# Altium footprint library ZLS_Lib.PcbLib: 25 footprints (part 1 of 2)
Each footprint in its own frame and in the unit in brackets; x right, y up, seen from the top. Pads: shape width x height; smd on the part's side, far side on the other; paste and mask are expansions set on the pad; w line width, h text height; cw(c..) or ccw(c..) is an arc to the next point about the centre after c.
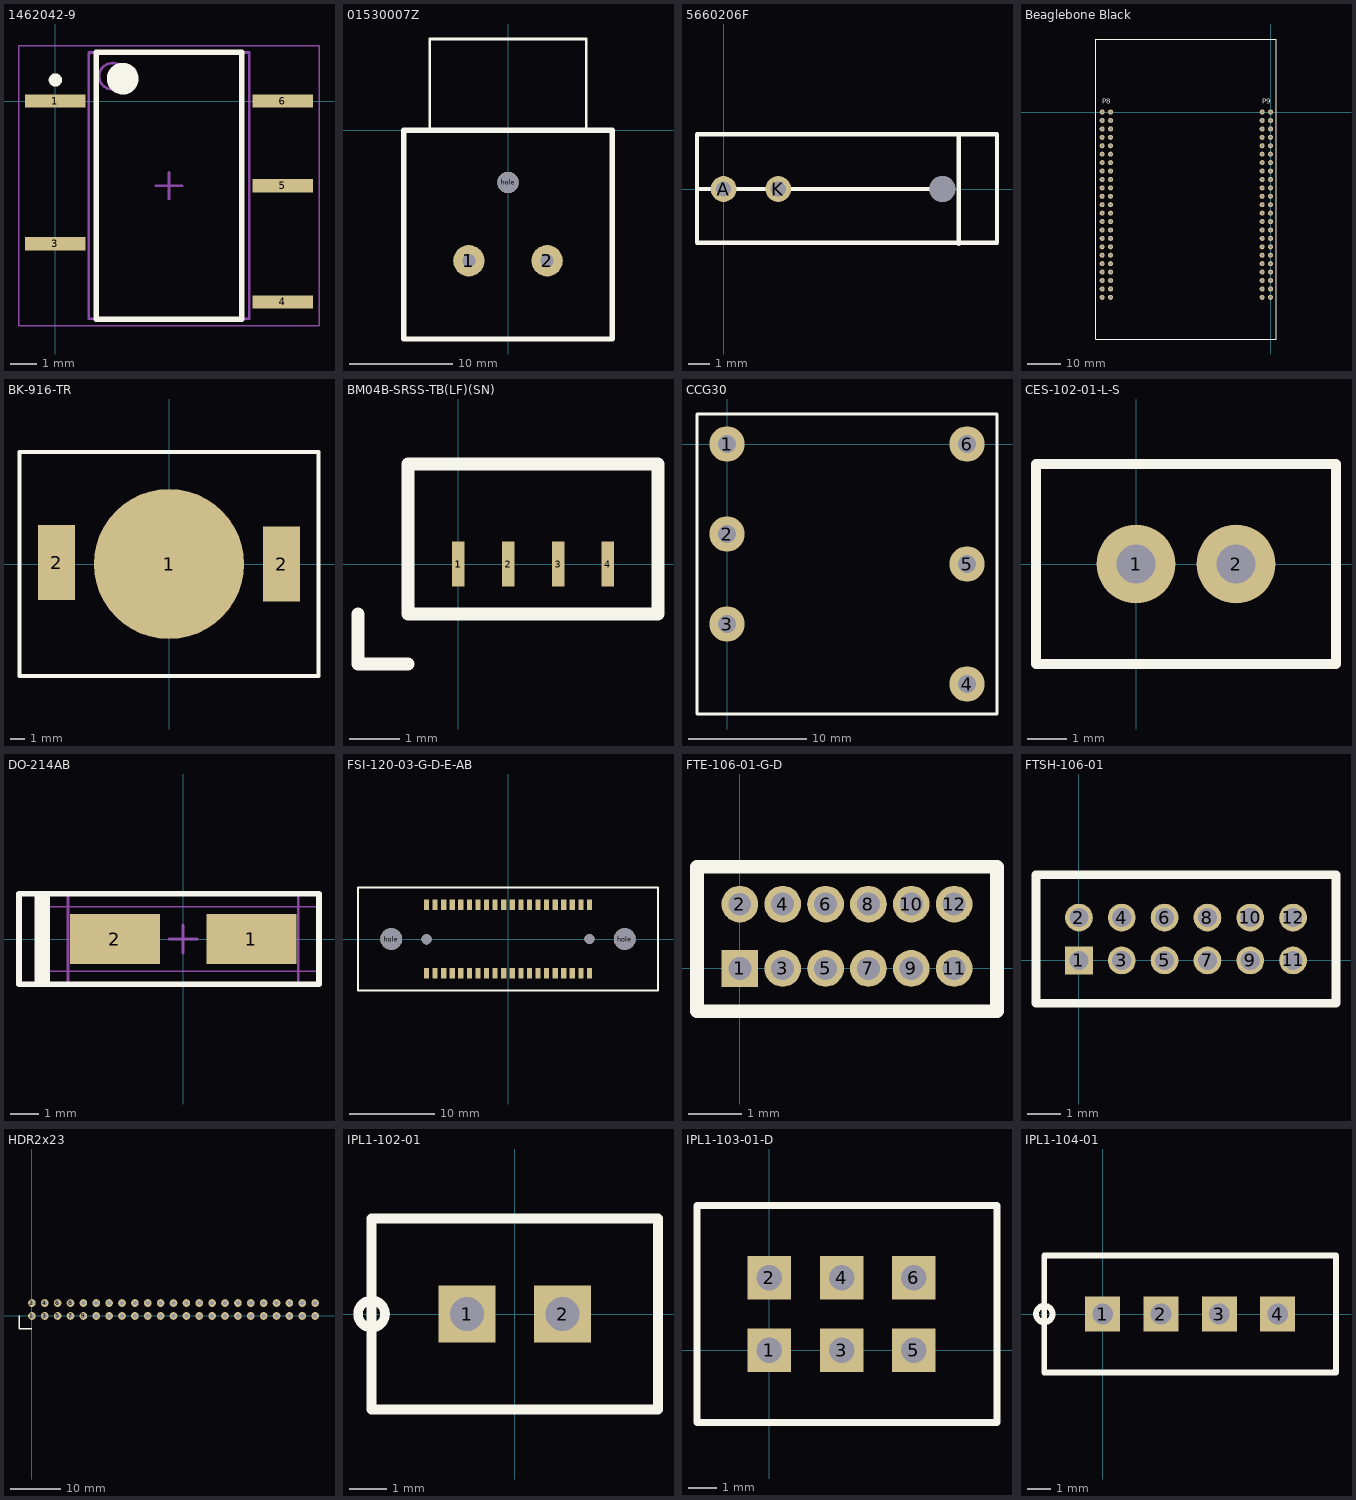
[diagram p0: the footprints below, top view; thin cyan lines are the x and y axes]

## 1462042-9 [mm] "RLY, 6-Leads, Body 10.08x6.08mm (max), Pitch 3.20mm, IPC Medium Density"
height 5.67
pads (5):
  rect 2.3x0.5 smd: 1(0,0) 3(0,-5.4) 4(8.6,-7.6) 5(8.6,-3.2) 6(8.6,0)
Top Overlay:
  circle w0.6: c2.55,0.85 r0.3
  circle w0.25: c0,0.8 r0.125
  lines w0.2: 1.55,-8.25 1.55,1.85 7.05,1.85 7.05,-8.25 1.55,-8.25
Mechanical 13:
  circle w0.1: c2.16,0.94 r0.5
  lines w0.1: 1.26,-8.24 1.26,1.84 7.34,1.84 7.34,-8.24 1.26,-8.24
Mechanical 15:
  lines w0.05: -1.375,-8.5 -1.375,2.1 9.975,2.1 9.975,-8.5 -1.375,-8.5
  lines w0.1: 3.8,-3.2 4.8,-3.2 ; 4.3,-3.7 4.3,-2.7
3D body "1462042-9.step": height 4.67, standoff 0, extent -0.735,-8.24 9.335,1.84

## 01530007Z [mil] "Fuse Holder"
height 300
pads (3):
  round 120 hole 50: 1(-150,-500) 2(150,-500)
  round 82 hole 82: hole(0,-200)
Top Overlay:
  lines w10: -300,0 -300,350 300,350 300,0
  lines w20: -400,-800 400,-800 400,0 -400,0 -400,-800
3D body: height 300, standoff 0, extent -399.98,-799.98 399.98,-0.02
3D body: height 300, standoff 0, extent -410,-810 410,-2
3D body: height 300, standoff 0, extent -299.98,0.02 299.98,349.98
3D body: height 300, standoff 0, extent -410,-810 410,0
3D body: height 300, standoff 0, extent -214,-564 214,-155
3D body: height 300, standoff 0, extent -214,-564 214,-155
3D body: height 300, standoff 0, extent -410,-810 410,0
3D body: height 300, standoff 0, extent -299.98,0.02 299.98,349.98
3D body: height 300, standoff 0, extent -410,-810 410,0
3D body: height 300, standoff 0, extent -399.98,-799.98 399.98,-0.02
3D body: height 300, standoff 0, extent -410,-810 410,0
3D body: height 300, standoff 0, extent -214,-564 214,-155
3D body: height 300, standoff 0, extent -214,-564 214,0
3D body: height 300, standoff 0, extent -410,-810 410,0
3D body: height 300, standoff 0, extent -399.98,-799.98 399.98,-0.02
3D body: height 300, standoff 0, extent -299.98,0.02 299.98,349.98

## 5660206F [mm]
pads (3):
  round 1.2 hole 0.7: A(0,0) K(2.54,0)
  round 1.21 hole 1.21: Alignment(10.16,0)
Top Overlay:
  lines w0.2: -1.235,0 1.34,0 ; 1.2,0 10.16,0 ; 8.491,2.54 8.781,2.54 12.7,2.54 12.7,-2.5 -1.235,-2.5 -1.235,2.54 3.815,2.54 7.192,2.54 10.922,2.54 10.922,-2.54
3D body: height 0, standoff 0, extent -0.702,-0.707 10.867,0.707
3D body: height 0, standoff 0, extent -1.335,-2.64 12.8,2.64
3D body: height 0, standoff 0, extent -1.234,-2.499 10.921,2.539
3D body: height 0, standoff 0, extent 10.923,-2.499 12.699,2.539
3D body: height 0, standoff 0, extent -1.335,-2.64 12.8,2.64
3D body: height 0, standoff 0, extent -1.234,-2.499 10.921,2.539
3D body: height 0, standoff 0, extent -1.335,-2.64 12.8,2.64
3D body: height 0, standoff 0, extent -0.702,-0.707 10.867,0.707
3D body: height 0, standoff 0, extent -0.702,-0.707 10.867,0.707
3D body: height 0, standoff 0, extent -1.335,-2.64 12.8,2.64
3D body: height 0, standoff 0, extent -1.234,-2.499 10.921,2.539
3D body: height 0, standoff 0, extent 10.923,-2.499 12.699,2.539
3D body: height 0, standoff 0, extent -1.335,-2.64 12.8,2.64
3D body: height 0, standoff 0, extent -0.702,-0.707 10.867,0.707
3D body: height 0, standoff 0, extent -1.335,-2.64 12.8,2.64
3D body: height 0, standoff 0, extent -1.234,-2.499 10.921,2.539
3D body: height 0, standoff 0, extent 10.923,-2.499 12.699,2.539
3D body: height 0, standoff 0, extent -1.335,-2.64 12.8,2.64

## Beaglebone Black [mil]
pads (92):
  round 60 hole 31.5: 8-1(-1900,0) 8-3(-1900,-100) 8-4(-2000,-100) 8-5(-1900,-200) 8-6(-2000,-200) 8-7(-1900,-300) 8-8(-2000,-300) 8-9(-1900,-400) 8-10(-2000,-400) 8-11(-1900,-500) 8-12(-2000,-500) 8-13(-1900,-600) 8-14(-2000,-600) 8-15(-1900,-700) 8-16(-2000,-700) 8-17(-1900,-800) 8-18(-2000,-800) 8-19(-1900,-900) 8-20(-2000,-900) 8-21(-1900,-1000) 8-22(-2000,-1000) 8-23(-1900,-1100) 8-24(-2000,-1100) 8-25(-1900,-1200) 8-26(-2000,-1200) 8-27(-1900,-1300) 8-28(-2000,-1300) 8-29(-1900,-1400) 8-30(-2000,-1400) 8-31(-1900,-1500) 8-32(-2000,-1500) 8-33(-1900,-1600) 8-34(-2000,-1600) 8-35(-1900,-1700) 8-36(-2000,-1700) 8-37(-1900,-1800) 8-38(-2000,-1800) 8-39(-1900,-1900) 8-40(-2000,-1900) 8-41(-1900,-2000) 8-42(-2000,-2000) 8-43(-1900,-2100) 8-44(-2000,-2100) 8-45(-1900,-2200) 8-46(-2000,-2200) 9-1(0,0) 9-2(-100,0) 9-3(0,-100) 9-4(-100,-100) 9-5(0,-200) 9-6(-100,-200) 9-7(0,-300) 9-8(-100,-300) 9-9(0,-400) 9-10(-100,-400) 9-11(0,-500) 9-12(-100,-500) 9-13(0,-600) 9-14(-100,-600) 9-15(0,-700) 9-16(-100,-700) 9-17(0,-800) 9-18(-100,-800) 9-19(0,-900) 9-20(-100,-900) 9-21(0,-1000) 9-22(-100,-1000) 9-23(0,-1100) 9-24(-100,-1100) 9-25(0,-1200) 9-26(-100,-1200) 9-27(0,-1300) 9-28(-100,-1300) 9-29(0,-1400) 9-30(-100,-1400) 9-31(0,-1500) 9-32(-100,-1500) 9-33(0,-1600) 9-34(-100,-1600) 9-35(0,-1700) 9-36(-100,-1700) 9-37(0,-1800) 9-38(-100,-1800) 9-39(0,-1900) 9-40(-100,-1900) 9-41(0,-2000) 9-42(-100,-2000) 9-43(0,-2100) 9-44(-100,-2100) 9-45(0,-2200) 9-46(-100,-2200)
  round 60 hole 30 paste+0: 8-2(-2000,0)
Top Overlay:
  lines w10: -2078.74,-2694.88 -306.1,-2694.88 69.88,-2694.88 69.88,868.11 -2078.74,868.11 -2078.74,-2694.88
  text "P8" at -2000,100 h60
  text "P9" at -100,100 h60
3D body "BEAGLEBONE_BLACK - NO LAN PORT.SLDPRT": height 493.04, standoff 146.06, extent -2077.76,-2686.02 74.2,875
3D body "_SSW_123_01_G_D_terminal_2.sldprt": height 335, standoff 0, extent -2047.5,-2263 -1852.5,57
3D body "_SSW_123_01_G_D_terminal_2.sldprt": height 335, standoff 0, extent -147.5,-2263 47.5,57

## BK-916-TR [mm]
height 3.6
pads (3):
  round 10.2 smd: 1(0,0)
  rect 2.5x5.1 smd: 2(-7.65,0.1) 2(7.65,0)
Top Overlay:
  lines w0.254: -10.16,-7.62 10.16,-7.62 10.16,7.62 -10.16,7.62 -10.16,-7.62
3D body: height 4.44, standoff 0, extent -10.1,-7.65 10.175,7.578

## BM04B-SRSS-TB(LF)(SN) [mm]
height 4.25
pads (5):
  rect 0.25x0.9 smd: 1(0,0) 1(0,0) 2(1,0) 3(2,0) 4(3,0)
Top Overlay:
  lines w0.254: -2,-1 -2,-2 -1,-2 ; -1,-1 -1,2 4,2 4,-1 -1,-1

## CCG30 [mm] "DC-DC Converter"
height 9.9
pads (6):
  round 3 hole 1.5: 1(0,0) 2(0,-7.62) 3(0,-15.24) 4(20.32,-20.32) 5(20.32,-10.16) 6(20.32,0)
Top Overlay:
  lines w0.254: -2.54,-22.86 22.86,-22.86 22.86,2.54 13.97,2.54 1.27,2.54 -2.54,2.54 -2.54,-1.905 -2.54,-15.875 -2.54,-22.86
3D body: height 9.9, standoff 0, extent -2.667,-22.987 22.987,2.667
3D body: height 9.9, standoff 0, extent -1.602,-21.922 21.922,1.602
3D body: height 9.9, standoff 0, extent -2.667,-22.987 22.987,2.667
3D body: height 9.9, standoff 0, extent -2.539,-22.859 22.859,2.539
3D body: height 9.9, standoff 0, extent -2.539,-22.859 22.859,2.539
3D body: height 9.9, standoff 0, extent -2.667,-22.987 22.987,2.667
3D body: height 9.9, standoff 0, extent -2.667,-22.987 22.987,2.667
3D body: height 9.9, standoff 0, extent -2.667,-22.987 22.987,2.667
3D body: height 9.9, standoff 0, extent -1.602,-21.922 21.922,1.602
3D body: height 9.9, standoff 0, extent -2.667,-22.987 22.987,2.667
3D body: height 9.9, standoff 0, extent -2.539,-22.859 22.859,2.539
3D body: height 9.9, standoff 0, extent -1.602,-21.922 21.922,1.602
3D body: height 9.9, standoff 0, extent -1.602,-21.922 21.922,1.602
3D body: height 9.9, standoff 0, extent -2.667,-22.987 22.987,2.667
3D body: height 9.9, standoff 0, extent -2.539,-22.859 22.859,2.539
3D body: height 9.9, standoff 0, extent -2.667,-22.987 22.987,2.667

## CES-102-01-L-S [mm]
pads (2):
  round 2 hole 1: 1(0,0) 2(2.54,0)
Top Overlay:
  lines w0.254: -2.54,-2.54 -2.54,2.54 5.08,2.54 5.08,-2.54 -2.54,-2.54
3D body "_C_45_01_02_S_4.sldprt": height 4.32, standoff -3.25, extent -1.168,-1.092 3.404,1.194
3D body "_CES_102_01_S_socket_2.sldprt": height 5.08, standoff 0, extent -1.448,-1.499 3.632,1.549

## DO-214AB [mil]
height 88.58
pads (2):
  rect 125x70 smd: 1(95,0) 2(-95,0)
Top Overlay:
  rectangle: -206.69,-62.99 -185.04,62.99
  lines w7.87: -228.35,-62.99 -228.35,62.99 188.98,62.99 188.98,-62.99 -228.35,-62.99
Mechanical 13:
  lines w3.94: -160.04,-63.98 -160.04,63.98 160.04,63.98 160.04,-63.98 -160.04,-63.98
Mechanical 15:
  lines w1.97: -186.02,-44.84 -186.02,44.84 186.02,44.84 186.02,-44.84 -186.02,-44.84
  lines w3.94: -19.68,0 19.68,0 ; 0,-19.68 0,19.68
3D body: height 78.74, standoff 0, extent -160.04,-63.98 -138.39,63.72
3D body: height 78.74, standoff 1.71, extent -114.76,-62.83 -91.14,62.59
3D body: height 78.74, standoff 1.77, extent -162.4,-61.02 114.37,64.32
3D body: height 78.74, standoff 0, extent 138.39,-63.98 160.04,63.72
3D body: height 78.74, standoff 0, extent -161.5,-39 161.5,39
3D body: height 78.74, standoff 0, extent -187.01,-45.83 187.01,45.83
3D body: height 78.74, standoff 0, extent -186,-44.82 186,44.82
3D body: height 78.74, standoff 0, extent -19.7,-19.7 19.7,19.7
3D body: height 78.74, standoff 0, extent -162.01,-65.94 162.01,65.94
3D body: height 78.74, standoff 0, extent -160.02,-63.96 160.02,63.96
3D body: height 78.74, standoff 0, extent -187.99,-66.93 192.91,66.93
3D body: height 78.74, standoff 0, extent -184.04,-62.97 188.96,62.97
3D body: height 78.74, standoff 0, extent -187.99,-66.93 192.91,66.93

## FSI-120-03-G-D-E-AB [mil]
height 50
pads (45):
  rect 24x49.5 smd: 1(-374.3,157.6) 1(-374.3,157.6) 2(-374.3,-157.6) 3(-334.9,157.6) 4(-334.9,-157.6) 5(-295.5,157.6) 6(-295.5,-157.6) 7(-256.1,157.6) 8(-256.1,-157.6) 9(-216.7,157.6) 10(-216.7,-157.6) 11(-177.3,157.6) 12(-177.3,-157.6) 13(-137.9,157.6) 14(-137.9,-157.6) 15(-98.5,157.6) 16(-98.5,-157.6) 17(-59.1,157.6) 18(-59.1,-157.6) 19(-19.7,157.6) 20(-19.7,-157.6) 21(19.7,157.6) 22(19.7,-157.6) 23(59.1,157.6) 24(59.1,-157.6) 25(98.5,157.6) 26(98.5,-157.6) 27(137.9,157.6) 28(137.9,-157.6) 29(177.3,157.6) 30(177.3,-157.6) 31(216.7,157.6) 32(216.7,-157.6) 33(256.1,157.6) 34(256.1,-157.6) 35(295.5,157.6) 36(295.5,-157.6) 37(334.9,157.6) 38(334.9,-157.6) 39(374.3,157.6) 40(374.3,-157.6)
  round 100 hole 100: hole(-536.2,0) hole(536.2,0)
  round 47 hole 47: hole(-374.3,-1.6) hole(374.3,0)
Top Overlay:
  lines w10: -688.98,-236.4 688.98,-236.4 688.98,236.4 -688.98,236.4 -688.98,-236.4
3D body "_FSI_120_03_D_E_pin_4.sldprt": height 152.47, standoff 0, extent -382.87,-179.38 379.33,6.15
3D body "_FSI_120_03_D_E_pin_4.sldprt": height 162.47, standoff 10, extent -381.89,-0.5 380.31,185.04
3D body "_FSI_120_03_G_D_E_AB_terminal_2.sldprt": height 112.11, standoff -61, extent -672.24,-176.43 670.28,168.45

## FTE-106-01-G-D [mil]
height 161
pads (12):
  rect 27x27 hole 16.93: 1(0,0)
  round 27 hole 16.73 paste+2: 2(0,47.24)
  round 27 hole 16.93: 3(31.5,0) 4(31.5,47.24) 5(63,0) 6(63,47.24) 7(94.5,0) 8(94.5,47.24) 9(125.98,0) 10(126,47.24) 11(157.5,0) 12(157.5,47.24)
Top Overlay:
  lines w10: -31.5,-31.5 -31.5,74.8 189,74.8 189,-31.5 -31.5,-31.5

## FTSH-106-01 [mil]
height 433.07
pads (12):
  rect 32.5x32.5 hole 22.27: 1(0,0)
  round 32.5 hole 22.27 paste+2: 2(0,50)
  round 32.5 hole 22.27: 3(50,0) 4(50,50) 5(100,0) 6(100,50) 7(150,0) 8(150,50) 9(200,0) 10(200,50) 11(250,0) 12(250,50)
Top Overlay:
  lines w10: -50,-50 300,-50 300,100 -50,100 -50,-50
3D body "_FTSH_106_01_F_D_K_pins2_6.sldprt": height 26.18, standoff -90, extent -10,-6 256,60
3D body "_FTSH_106_01_F_D_K_pins1_4.sldprt": height 219, standoff 50, extent -12,-9 254,57
3D body "_FTSH_106_01_F_D_001_K_body_2.sldprt": height 225, standoff 0, extent -29,-76 271,124

## HDR2x23 [mil]
height 375
pads (46):
  round 60 hole 31.5: 1(0,0) 2(0,100) 3(100,0) 4(100,100) 5(200,0) 6(200,100) 7(300,0) 8(300,100) 9(400,0) 10(400,100) 11(500,0) 12(500,100) 13(600,0) 14(600,100) 15(700,0) 16(700,100) 17(800,0) 18(800,100) 19(900,0) 20(900,100) 21(1000,0) 22(1000,100) 23(1100,0) 24(1100,100) 25(1200,0) 26(1200,100) 27(1300,0) 28(1300,100) 29(1400,0) 30(1400,100) 31(1500,0) 32(1500,100) 33(1600,0) 34(1600,100) 35(1700,0) 36(1700,100) 37(1800,0) 38(1800,100) 39(1900,0) 40(1900,100) 41(2000,0) 42(2000,100) 43(2100,0) 44(2100,100) 45(2200,0) 46(2200,100)
Top Overlay:
  lines w10: -100,0 -100,-100 0,-100
3D body: height 375, standoff 0, extent -34,-34 2234,134
3D body: height 375, standoff 0, extent -105,-105 5,5
3D body: height 375, standoff 0, extent -100.02,-100.02 0.02,0.02
3D body: height 375, standoff 0, extent -105,-105 2234,134

## IPL1-102-01 [mil]
height 161
pads (2):
  rect 60x60 hole 35.43: 1(-50,0) 2(50,0)
Top Overlay:
  circle w10: c-150,0 r14.14
  lines w10: -150,-100 -150,100 150,100 150,-100 -150,-100
3D body "_IPL1_102_01_S_header_2.sldprt": height 320, standoff 0, extent -133.94,-130.91 126.06,129.09

## IPL1-103-01-D [mil]
height 161
pads (6):
  rect 60x60 hole 35.43: 1(0,0) 2(0,100) 3(100,0) 4(100,100) 5(200,0) 6(200,100)
Top Overlay:
  lines w10: -100,-100 -100,-26 -100,200 315,200 315,-100 -26,-100 -100,-100
3D body: height 161, standoff 0, extent -100.02,-26.02 -100.01,-26.01
3D body "_IPL1_103_01_D_header_2.sldprt": height 320, standoff 0, extent -80,-100 280,210
3D body "_T_1S64_01_03_D_4.sldprt": height 305, standoff -120, extent -7.87,-11.81 217.12,113.19

## IPL1-104-01 [mil]
height 21496.06
pads (4):
  rect 60x60 hole 35.43: 1(0,0) 2(100,0) 3(200,0) 4(300,0)
Top Overlay:
  circle w10: c-100,0 r14.14
  lines w10: -100,-100 -100,100 400,100 400,-100 -100,-100
3D body "_IPL1_104_01_S_header_2.sldprt": height 320, standoff 0, extent -85.32,-154.62 374.68,105.38